# Altium footprint library IC.PcbLib: 220 footprints (part 13 of 14)
Each footprint in its own frame and in the unit in brackets; x right, y up, seen from the top. Pads: shape width x height; smd on the part's side, far side on the other; paste and mask are expansions set on the pad; w line width, h text height; cw(c..) or ccw(c..) is an arc to the next point about the centre after c.
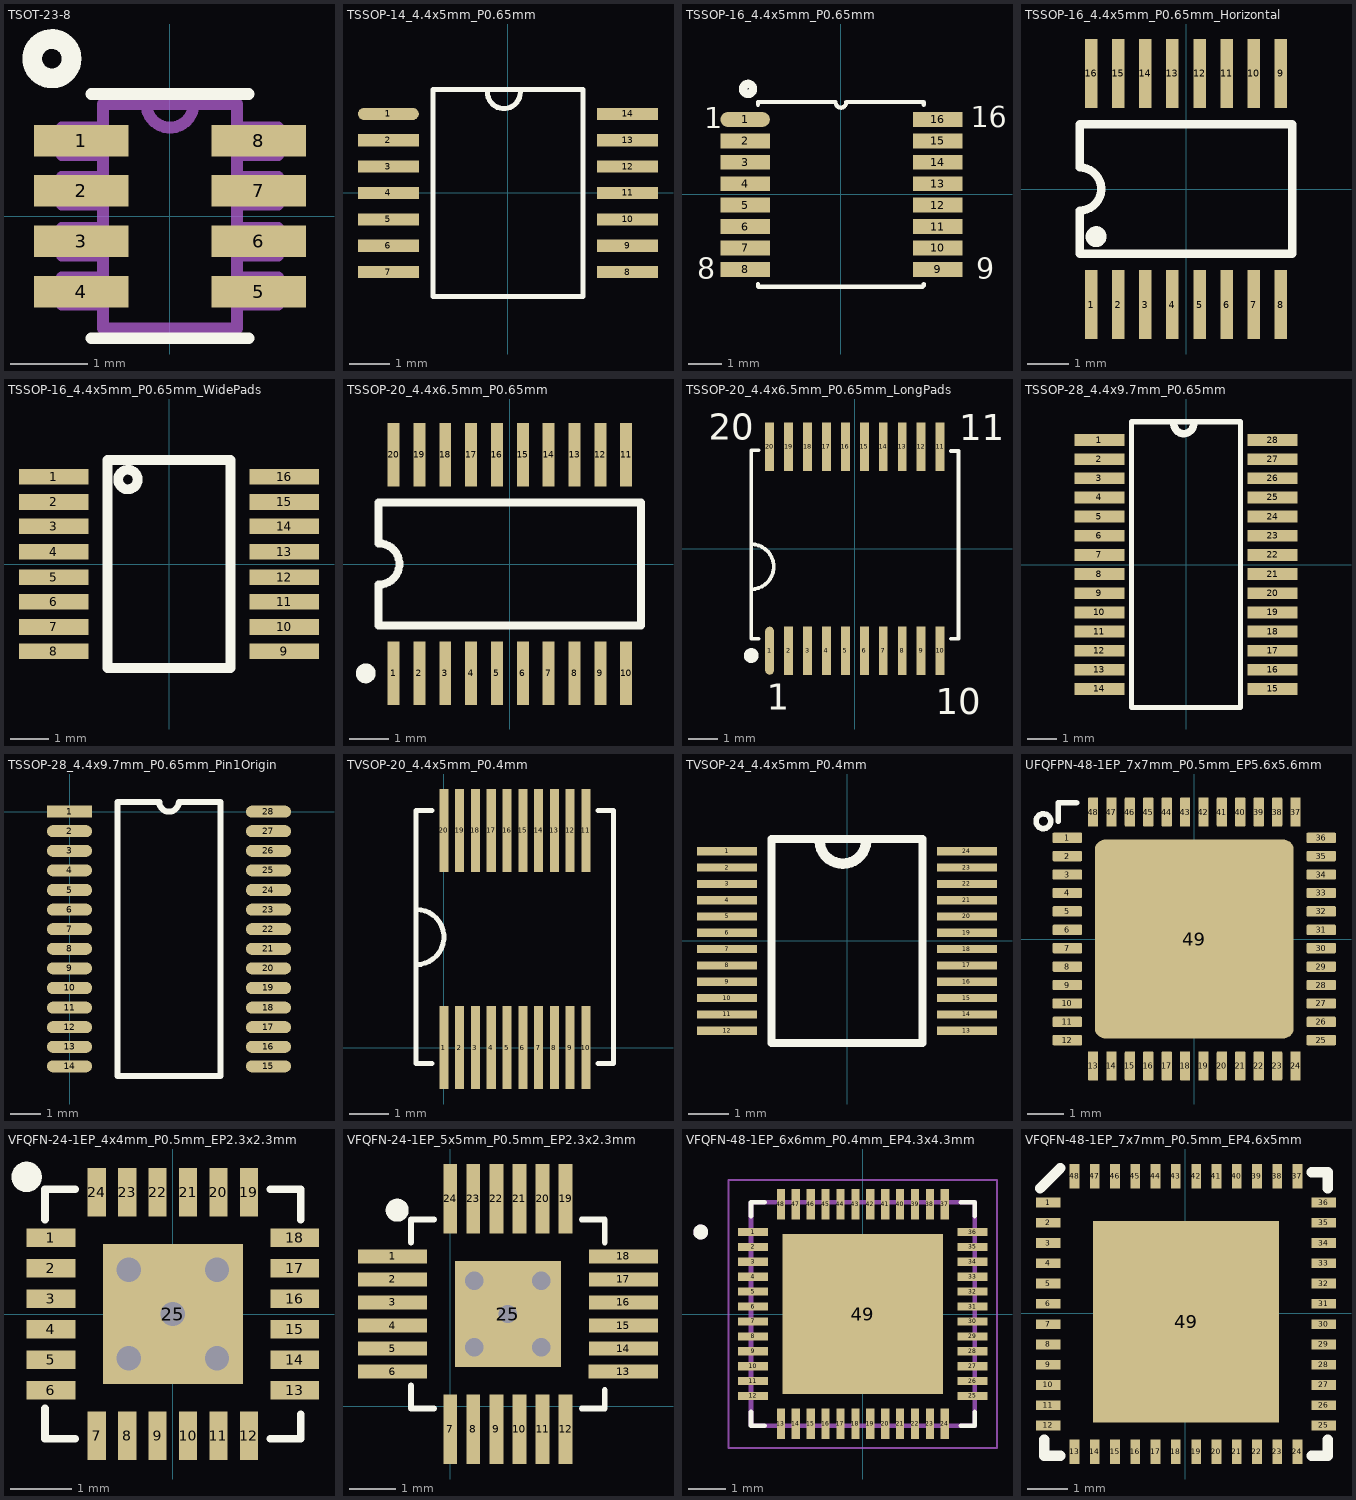
[diagram p12: the footprints below, top view; thin cyan lines are the x and y axes]

## TSOT-23-8 [mil] "TSOT-23-8, pitch 0.65mm, span 2.29mm"
pads (8):
  rect 48x16 smd: 1(-45,38.39) 2(-45,12.8) 3(-45,-12.8) 4(-45,-38.39) 5(45,-38.39) 6(45,-12.8) 7(45,12.8) 8(45,38.39)
Top Overlay:
  circle w10: c-60,80 r10
  lines w6: -40,-62 40,-62 ; -40,62 40,62
Mechanical 13:
  lines w6: -12,57 ccw(c0,57) 12,57 ; -12,57 12,57 ; -12,57 -34,57 -34,-57 34,-57 34,57 12,57 ; -55,-45 -34,-45 -34,-31 -55,-31 -55,-45 ; -55,-20 -34,-20 -34,-6 -55,-6 -55,-20 ; -55,6 -34,6 -34,20 -55,20 -55,6 ; -55,31 -34,31 -34,45 -55,45 -55,31 ; 34,-45 55,-45 55,-31 34,-31 34,-45 ; 34,-20 55,-20 55,-6 34,-6 34,-20 ; 34,6 55,6 55,20 34,20 34,6 ; 34,31 55,31 55,45 34,45 34,31
3D body "step_temp.STEP": height 35.43, standoff -3.94, extent -55.12,-57.09 55.12,57.08

## TSSOP-14_4.4x5mm_P0.65mm [mm] "TSSOP-14, body 4.4x5.0mm, pitch 0.65mm"
height 2
pads (14):
  oval 1.5x0.3 smd: 1(-2.95,1.95)
  rect 1.5x0.3 smd: 2(-2.95,1.3) 3(-2.95,0.65) 4(-2.95,0) 5(-2.95,-0.65) 6(-2.95,-1.3) 7(-2.95,-1.95) 8(2.95,-1.95) 9(2.95,-1.3) 10(2.95,-0.65) 11(2.95,0) 12(2.95,0.65) 13(2.95,1.3) 14(2.95,1.95)
Top Overlay:
  lines w0.127: -0.509,2.489 ccw(c-0.102,2.489) 0.306,2.489 ; -1.85,-2.55 -1.85,2.55 1.85,2.55 1.85,-2.55 -1.85,-2.55
3D body "TSSOP-14.STEP": height 1.2, standoff 0, extent -3.2,-2.5 3.2,2.5

## TSSOP-16_4.4x5mm_P0.65mm [mm] "TSSOP-16, body 4.4x5.0mm, pitch 0.65mm, span 5.85mm"
height 1.2
pads (16):
  oval 1.5x0.45 smd mask+0.076: 1(-2.908,2.273)
  rect 1.5x0.45 smd mask+0.076: 2(-2.908,1.623) 3(-2.908,0.973) 4(-2.908,0.323) 5(-2.908,-0.327) 6(-2.908,-0.977) 7(-2.908,-1.627) 8(-2.908,-2.277) 9(2.942,-2.277) 10(2.942,-1.627) 11(2.942,-0.977) 12(2.942,-0.327) 13(2.942,0.323) 14(2.942,0.973) 15(2.942,1.623) 16(2.942,2.273)
Top Overlay:
  circle w0.254: c-2.819,3.2 r0.152
  lines w0.127: -2.515,-2.718 -2.515,-2.794 -2.502,-2.807 2.477,-2.807 2.515,-2.769 2.515,-2.718 ; -2.515,2.718 -2.515,2.794 ; -2.515,2.807 -0.164,2.807 ; -0.162,2.796 ccw(c0,2.794) 0.163,2.794 ; 0.164,2.807 2.502,2.807 2.515,2.794 2.515,2.718
  text "1" at -4.152,2.011 h0.64
  text "16" at 3.937,2.032 h0.64
  text "9" at 4.103,-2.561 h0.64
  text "8" at -4.369,-2.565 h0.64
3D body "TSSOP-16 5_1x4_4.STEP": height 1.2, standoff 0.1, extent -3.2,-2.55 3.2,2.55

## TSSOP-16_4.4x5mm_P0.65mm_Horizontal [mm] "TSSOP-16 rotated 90deg, body 4.4x5.0mm, pitch 0.65mm"
height 1.1
pads (16):
  rect 0.3x1.65 smd: 1(-2.275,-2.775) 2(-1.625,-2.775) 3(-0.975,-2.775) 4(-0.325,-2.775) 5(0.325,-2.775) 6(0.975,-2.775) 7(1.625,-2.775) 8(2.275,-2.775) 9(2.275,2.775) 10(1.625,2.775) 11(0.975,2.775) 12(0.325,2.775) 13(-0.325,2.775) 14(-0.975,2.775) 15(-1.625,2.775) 16(-2.275,2.775)
Top Overlay:
  circle w0.25: c-2.157,-1.143 r0.125
  lines w0.2: -2.55,-1.55 -2.55,-0.517 ccw(c-2.55,0) -2.55,0.517 -2.55,1.55 2.55,1.55 2.55,-1.55 -2.55,-1.55
3D body "TSSOP-16_4.4x5mm_P0.65mm_H.step": height 1.45, standoff 0, extent -2.395,-3.435 2.395,3.435

## TSSOP-16_4.4x5mm_P0.65mm_WidePads [mil] "TSSOP-16, body 4.4x5.0mm, pitch 0.65mm, span 6.0mm"
height 43.31
pads (16):
  rect 71x16 smd: 1(-118.11,89.5) 2(-118.11,63.5) 3(-118.11,38.5) 4(-118.11,12.5) 5(-118.11,-13.5) 6(-118.11,-38.5) 7(-118.11,-64.5) 8(-118.11,-89.5) 9(118.11,-89.5) 10(118.11,-64.5) 11(118.11,-38.5) 12(118.11,-13.5) 13(118.11,12.5) 14(118.11,38.5) 15(118.11,63.5) 16(118.11,89.5)
Top Overlay:
  circle w10: c-42,86.5 r10
  lines w10: -62.99,106.1 -62.99,-106.5 62.99,-106.5 62.99,106.1 ; -62.99,106.5 62.99,106.5
3D body "TSSOP-16.stp": height 43.67, standoff 0.39, extent -126.58,-100.4 126.59,100.4

## TSSOP-20_4.4x6.5mm_P0.65mm [mm] "TSSOP-20, body 4.4x6.5mm, pitch 0.65mm, span 5.5mm"
height 1.1
pads (20):
  rect 0.3x1.6 smd: 1(-2.925,-2.75) 2(-2.275,-2.75) 3(-1.625,-2.75) 4(-0.975,-2.75) 5(-0.325,-2.75) 6(0.325,-2.75) 7(0.975,-2.75) 8(1.625,-2.75) 9(2.275,-2.75) 10(2.925,-2.75) 11(2.925,2.75) 12(2.275,2.75) 13(1.625,2.75) 14(0.975,2.75) 15(0.325,2.75) 16(-0.325,2.75) 17(-0.975,2.75) 18(-1.625,2.75) 19(-2.275,2.75) 20(-2.925,2.75)
Top Overlay:
  circle w0.25: c-3.625,-2.75 r0.125
  lines w0.2: -3.3,-1.55 -3.3,-0.52 ccw(c-3.3,0) -3.3,0.52 -3.3,1.55 3.3,1.55 3.3,-1.55 -3.3,-1.55
3D body "tssop-20.step": height 1.12, standoff -0.08, extent -3.3,-3.3 3.3,3.3

## TSSOP-20_4.4x6.5mm_P0.65mm_LongPads [mil] "TSSOP-20, body 4.4x6.5mm, pitch 0.65mm, span 7.0mm"
pads (20):
  oval 12x65 smd mask+3: 1(-115.16,-137.8)
  rect 12x65 smd mask+3: 2(-89.56,-137.8) 3(-63.97,-137.8) 4(-38.38,-137.8) 5(-12.8,-137.8) 6(12.8,-137.8) 7(38.38,-137.8) 8(63.98,-137.8) 9(89.56,-137.8) 10(115.16,-137.8) 11(115.16,137.8) 12(89.56,137.8) 13(63.98,137.8) 14(38.38,137.8) 15(12.8,137.8) 16(-12.8,137.8) 17(-38.38,137.8) 18(-63.97,137.8) 19(-89.56,137.8) 20(-115.16,137.8)
Top Overlay:
  circle w10: c-140,-144.3 r5
  lines w5: -140,-54.71 ccw(c-140,-24.3) -140,6.12 ; -130.01,-121.8 -140,-121.8 -140,132.88 -130,132.88 ; 130,-121.8 140,-121.8 140,132.14 130.01,132.14
  text "20" at -197.45,147.05 h35
  text "11" at 141.23,146.45 h35
  text "10" at 109,-223.3 h35
  text "1" at -119,-217.3 h35
3D body "TSSOP-20.STEP": height 47.24, standoff 0, extent -130,-129.76 129.84,128.11

## TSSOP-28_4.4x9.7mm_P0.65mm [mm] "TSSOP-28, body 4.4x9.7mm, pitch 0.65mm, span 5.88mm"
height 1.1
pads (28):
  rect 1.7x0.4 smd mask+0.076: 1(-2.938,4.225) 2(-2.938,3.575) 3(-2.938,2.925) 4(-2.938,2.275) 5(-2.938,1.625) 6(-2.938,0.975) 7(-2.938,0.325) 8(-2.938,-0.325) 9(-2.938,-0.975) 10(-2.938,-1.625) 11(-2.938,-2.275) 12(-2.938,-2.925) 13(-2.938,-3.575) 14(-2.938,-4.225) 15(2.938,-4.225) 16(2.938,-3.575) 17(2.938,-2.925) 18(2.938,-2.275) 19(2.938,-1.625) 20(2.938,-0.975) 21(2.938,-0.325) 22(2.938,0.325) 23(2.938,0.975) 24(2.938,1.625) 25(2.938,2.275) 26(2.938,2.925) 27(2.938,3.575) 28(2.938,4.225)
Top Overlay:
  lines w0.178: -1.85,-4.85 -1.85,4.85 1.85,4.85 1.85,-4.85 -1.85,-4.85
  lines w0.254: -0.409,4.745 ccw(c-0.076,4.775) 0.257,4.796
3D body "PCA9685PW,112.stp": height 1.1, standoff 0, extent -3.2,-4.85 3.2,4.85

## TSSOP-28_4.4x9.7mm_P0.65mm_Pin1Origin [mm] "TSSOP-28, body 4.4x9.7mm, pitch 0.65mm, span 6.6mm, pin-1 origin"
pads (28):
  rect 1.5x0.4 smd: 1(0,0)
  oval 1.5x0.4 smd: 2(0,-0.65) 3(0,-1.3) 4(0,-1.95) 5(0,-2.6) 6(0,-3.25) 7(0,-3.9) 8(0,-4.55) 9(0,-5.2) 10(0,-5.85) 11(0,-6.5) 12(0,-7.15) 13(0,-7.8) 14(0,-8.45) 15(6.6,-8.45) 16(6.6,-7.8) 17(6.6,-7.15) 18(6.6,-6.5) 19(6.6,-5.85) 20(6.6,-5.2) 21(6.6,-4.55) 22(6.6,-3.9) 23(6.6,-3.25) 24(6.6,-2.6) 25(6.6,-1.95) 26(6.6,-1.3) 27(6.6,-0.65) 28(6.6,0)
Top Overlay:
  lines w0.2: 1.585,0.325 1.585,-8.775 5.015,-8.775 5.015,0.325 3.625,0.325 cw(c3.3,0.325) 2.975,0.325 ; 1.593,0.325 2.983,0.325
3D body "TSSOP-28_P065.STEP": height 0.95, standoff -0.03, extent 0.102,-9.065 6.502,0.635

## TVSOP-20_4.4x5mm_P0.4mm [mm] "TVSOP-20, body 4.4x5.0mm, pitch 0.4mm"
height 1.2
pads (20):
  rect 0.23x2.1 smd mask+0.076: 1(0,0) 2(0.4,0) 3(0.8,0) 4(1.2,0) 5(1.6,0) 6(2,0) 7(2.4,0) 8(2.8,0) 9(3.2,0) 10(3.6,0) 11(3.6,5.5) 12(3.2,5.5) 13(2.8,5.5) 14(2.4,5.5) 15(2,5.5) 16(1.6,5.5) 17(1.2,5.5) 18(0.8,5.5) 19(0.4,5.5) 20(0,5.5)
Top Overlay:
  lines w0.127: -0.7,2.1 ccw(c-0.7,2.8) -0.7,3.5 ; -0.3,-0.4 -0.7,-0.4 -0.7,5.1 -0.7,6 ; -0.3,6 -0.7,6 ; 3.9,6 4.3,6 ; -0.7,6 -0.7,6 ; 3.9,-0.4 4.3,-0.4 4.3,6 ; 3.9,-0.4 3.9,-0.4 ; 4.3,6 4.3,6
3D body "SN74CB3Q3245DGVR.stp": height 1.2, standoff 0, extent -0.7,-0.4 4.3,6

## TVSOP-24_4.4x5mm_P0.4mm [mm] "TVSOP-24, body 4.4x5.0mm, pitch 0.4mm"
height 1.2
pads (24):
  rect 1.475x0.2 smd: 1(-2.938,2.2) 2(-2.938,1.8) 3(-2.938,1.4) 4(-2.938,1) 5(-2.938,0.6) 6(-2.938,0.2) 7(-2.938,-0.2) 8(-2.938,-0.6) 9(-2.938,-1) 10(-2.938,-1.4) 11(-2.938,-1.8) 12(-2.938,-2.2) 13(2.938,-2.2) 14(2.938,-1.8) 15(2.938,-1.4) 16(2.938,-1) 17(2.938,-0.6) 18(2.938,-0.2) 19(2.938,0.2) 20(2.938,0.6) 21(2.938,1) 22(2.938,1.4) 23(2.938,1.8) 24(2.938,2.2)
Top Overlay:
  lines w0.2: -1.85,-2.5 -1.85,2.5 1.85,2.5 1.85,-2.5 -1.85,-2.5
  lines w0.254: -0.672,2.439 ccw(c-0.102,2.464) 0.469,2.441
3D body "SN74LVC8T245DGVR.stp": height 1.2, standoff 0, extent -3.2,-2.5 3.2,2.5

## UFQFPN-48-1EP_7x7mm_P0.5mm_EP5.6x5.6mm [mm] "UFQFPN-48 7x7mm pitch 0.5mm with exposed thermal pad 5.4x5.4mm (STM32F411CEU6)"
height 0.62
pads (49):
  rrect25% 0.8x0.28 smd: 1(-3.45,2.75) 2(-3.45,2.25) 3(-3.45,1.75) 4(-3.45,1.25) 5(-3.45,0.75) 6(-3.45,0.25) 7(-3.45,-0.25) 8(-3.45,-0.75) 9(-3.45,-1.25) 10(-3.45,-1.75) 11(-3.45,-2.25) 12(-3.45,-2.75) 25(3.45,-2.75) 26(3.45,-2.25) 27(3.45,-1.75) 28(3.45,-1.25) 29(3.45,-0.75) 30(3.45,-0.25) 31(3.45,0.25) 32(3.45,0.75) 33(3.45,1.25) 34(3.45,1.75) 35(3.45,2.25) 36(3.45,2.75)
  rrect25% 0.28x0.8 smd: 13(-2.75,-3.45) 14(-2.25,-3.45) 15(-1.75,-3.45) 16(-1.25,-3.45) 17(-0.75,-3.45) 18(-0.25,-3.45) 19(0.25,-3.45) 20(0.75,-3.45) 21(1.25,-3.45) 22(1.75,-3.45) 23(2.25,-3.45) 24(2.75,-3.45) 37(2.75,3.45) 38(2.25,3.45) 39(1.75,3.45) 40(1.25,3.45) 41(0.75,3.45) 42(0.25,3.45) 43(-0.25,3.45) 44(-0.75,3.45) 45(-1.25,3.45) 46(-1.75,3.45) 47(-2.25,3.45) 48(-2.75,3.45)
  rrect10% 5.4x5.4 smd: 49(0,0)
Top Overlay:
  circle w0.15: c-4.1,3.2 r0.2
  lines w0.15: -3.7,3.2 -3.7,3.7 -3.2,3.7
3D body "UFQFPN-48_7x7mm.step": height 0.65, standoff 0, extent -3.525,-3.525 3.525,3.525

## VFQFN-24-1EP_4x4mm_P0.5mm_EP2.3x2.3mm [mm] "VFQFN-24 with exposed pad 2.3x2.3mm, body 4x4mm, pitch 0.5mm, span 4.0mm"
height 1
pads (25):
  rect 0.8x0.3 smd mask+0.076: 1(-2,1.25) 2(-2,0.75) 3(-2,0.25) 4(-2,-0.25) 5(-2,-0.75) 6(-2,-1.25) 13(2,-1.25) 14(2,-0.75) 15(2,-0.25) 16(2,0.25) 17(2,0.75) 18(2,1.25)
  rect 0.3x0.8 smd mask+0.076: 7(-1.25,-2) 8(-0.75,-2) 9(-0.25,-2) 10(0.25,-2) 11(0.75,-2) 12(1.25,-2) 19(1.25,2) 20(0.75,2) 21(0.25,2) 22(-0.25,2) 23(-0.75,2) 24(-1.25,2)
  rect 2.3x2.3 smd mask+0.076: 25(0,0)
via 0.725,-0.725 diameter 0.8 hole 0.4
via -0.725,-0.725 diameter 0.8 hole 0.4
via -0.725,0.725 diameter 0.8 hole 0.4
via 0.725,0.725 diameter 0.8 hole 0.4
via 0,0 diameter 0.8 hole 0.4
Top Overlay:
  lines w0.127: -2.1,-1.55 -2.1,-2.05 -1.6,-2.05 ; -2.1,1.55 -2.1,2.05 -1.7,2.05 -1.6,2.05 ; 1.6,-2.05 2.1,-2.05 2.1,-1.65 ; 1.6,2.05 2.1,2.05 2.1,1.55
  lines w0.25: -2.283,2.294 ccw(c-2.4,2.25) -2.275,2.25
3D body "DRV8701PRGET.stp": height 1, standoff 0, extent -2.05,-2.05 2.05,2.05

## VFQFN-24-1EP_5x5mm_P0.5mm_EP2.3x2.3mm [mm] "VFQFN-24 with exposed pad 2.3x2.3mm, span 5.0mm, pitch 0.5mm (DRV8701)"
height 1
pads (25):
  rect 1.5x0.3 smd mask+0.076: 1(-1.25,3.25) 2(-1.25,2.75) 3(-1.25,2.25) 4(-1.25,1.75) 5(-1.25,1.25) 6(-1.25,0.75) 13(3.75,0.75) 14(3.754,1.25) 15(3.754,1.75) 16(3.754,2.25) 17(3.754,2.75) 18(3.754,3.25)
  rect 0.3x1.5 smd mask+0.076: 7(0,-0.5) 8(0.5,-0.5) 9(1,-0.5) 10(1.5,-0.5) 11(2,-0.5) 12(2.5,-0.5) 19(2.5,4.5) 20(2,4.5) 21(1.5,4.5) 22(1,4.5) 23(0.5,4.5) 24(0,4.5)
  rect 2.3x2.3 smd mask+0.076: 25(1.25,2)
via 1.975,1.275 diameter 0.8 hole 0.4
via 0.525,1.275 diameter 0.8 hole 0.4
via 0.525,2.725 diameter 0.8 hole 0.4
via 1.975,2.725 diameter 0.8 hole 0.4
via 1.25,2 diameter 0.8 hole 0.4
Top Overlay:
  lines w0.127: -0.85,0.45 -0.85,-0.05 -0.35,-0.05 ; -0.85,3.55 -0.85,4.05 -0.45,4.05 -0.35,4.05 ; 2.85,-0.05 3.35,-0.05 3.35,0.35 ; 2.85,4.05 3.35,4.05 3.35,3.55
  lines w0.25: -1.033,4.294 ccw(c-1.15,4.25) -1.025,4.25
3D body "DRV8701PRGET.stp": height 1, standoff 0, extent -0.8,-0.05 3.3,4.05

## VFQFN-48-1EP_6x6mm_P0.4mm_EP4.3x4.3mm [mm] "VFQFN-48 with exposed pad 4.3x4.3mm, body 6x6mm, pitch 0.4mm"
height 0.9
pads (49):
  rect 0.81x0.22 smd mask+0.05: 1(-2.945,2.2) 2(-2.945,1.8) 3(-2.945,1.4) 4(-2.945,1) 5(-2.945,0.6) 6(-2.945,0.2) 7(-2.945,-0.2) 8(-2.945,-0.6) 9(-2.945,-1) 10(-2.945,-1.4) 11(-2.945,-1.8) 12(-2.945,-2.2) 25(2.945,-2.2) 26(2.945,-1.8) 27(2.945,-1.4) 28(2.945,-1) 29(2.945,-0.6) 30(2.945,-0.2) 31(2.945,0.2) 32(2.945,0.6) 33(2.945,1) 34(2.945,1.4) 35(2.945,1.8) 36(2.945,2.2)
  rect 0.22x0.81 smd mask+0.05: 13(-2.2,-2.945) 14(-1.8,-2.945) 15(-1.4,-2.945) 16(-1,-2.945) 17(-0.6,-2.945) 18(-0.2,-2.945) 19(0.2,-2.945) 20(0.6,-2.945) 21(1,-2.945) 22(1.4,-2.945) 23(1.8,-2.945) 24(2.2,-2.945) 37(2.2,2.945) 38(1.8,2.945) 39(1.4,2.945) 40(1,2.945) 41(0.6,2.945) 42(0.2,2.945) 43(-0.2,2.945) 44(-0.6,2.945) 45(-1,2.945) 46(-1.4,2.945) 47(-1.8,2.945) 48(-2.2,2.945)
  rect 4.3x4.3 smd paste-3: 49(0,0)
Top Overlay:
  circle w0.2: c-4.35,2.2 r0.1
  lines w0.127: -3,-2.63 -3,-3 -2.63,-3 ; -3,2.63 -3,3 -2.63,3 ; 2.63,-3 3,-3 3,-2.63 ; 2.63,3 3,3 3,2.63
Top Paste:
  region: -0.265,0.265 -1.625,0.265 -1.625,1.625 -0.265,1.625
  region: 1.625,0.265 0.265,0.265 0.265,1.625 1.625,1.625
  region: -0.265,-1.625 -1.625,-1.625 -1.625,-0.265 -0.265,-0.265
  region: 1.625,-1.625 0.265,-1.625 0.265,-0.265 1.625,-0.265
Mechanical 13:
  circle w0.2: c-4.35,2.2 r0.1
  lines w0.127: -3,-3 3,-3 3,3 -3,3 -3,-3
Mechanical 15:
  lines w0.05: -3.6,-3.6 -3.6,3.6 3.6,3.6 3.6,-3.6 -3.6,-3.6
3D body "step_temp.STEP": height 0.85, standoff -0.05, extent -3,-3 3,3

## VFQFN-48-1EP_7x7mm_P0.5mm_EP4.6x5mm [mm] "VFQFN-48 with exposed pad 4.6x4.97mm, body 7x7mm, pitch 0.5mm"
pads (49):
  rect 0.6x0.24 smd: 1(-3.386,2.737) 2(-3.386,2.237) 3(-3.386,1.737) 4(-3.386,1.237) 5(-3.386,0.737) 6(-3.386,0.237) 7(-3.386,-0.263) 8(-3.386,-0.763) 9(-3.386,-1.263) 10(-3.386,-1.763) 11(-3.386,-2.263) 12(-3.386,-2.763) 25(3.413,-2.763) 26(3.413,-2.263) 27(3.413,-1.763) 28(3.413,-1.263) 29(3.413,-0.763) 30(3.413,-0.263) 31(3.413,0.237) 32(3.413,0.737) 33(3.413,1.237) 34(3.413,1.737) 35(3.413,2.237) 36(3.413,2.737)
  rect 0.24x0.6 smd: 13(-2.737,-3.413) 14(-2.237,-3.413) 15(-1.737,-3.413) 16(-1.237,-3.413) 17(-0.737,-3.413) 18(-0.237,-3.413) 19(0.263,-3.413) 20(0.763,-3.413) 21(1.263,-3.413) 22(1.763,-3.413) 23(2.263,-3.413) 24(2.764,-3.413) 37(2.764,3.386) 38(2.263,3.386) 39(1.763,3.386) 40(1.263,3.386) 41(0.763,3.386) 42(0.263,3.386) 43(-0.237,3.386) 44(-0.737,3.386) 45(-1.237,3.386) 46(-1.737,3.386) 47(-2.237,3.386) 48(-2.737,3.386)
  rect 4.6x4.975 smd: 49(0.014,-0.202)
Top Overlay:
  lines w0.254: -3.586,3.086 -3.086,3.586 ; -3.486,-3.115 -3.486,-3.513 -3.088,-3.513 ; 3.115,-3.513 3.513,-3.513 3.513,-3.115 ; 3.115,3.486 3.513,3.486 3.513,3.088
3D body "VFQFN-48-1EP_7x7mm_P0.5mm_.step": height 0.93, standoff 0, extent -3.627,-3.514 3.654,3.487